# Altium footprint library 接插件.PcbLib: 88 footprints (part 5 of 6)
Each footprint in its own frame and in the unit in brackets; x right, y up, seen from the top. Pads: shape width x height; smd on the part's side, far side on the other; paste and mask are expansions set on the pad; w line width, h text height; cw(c..) or ccw(c..) is an arc to the next point about the centre after c.
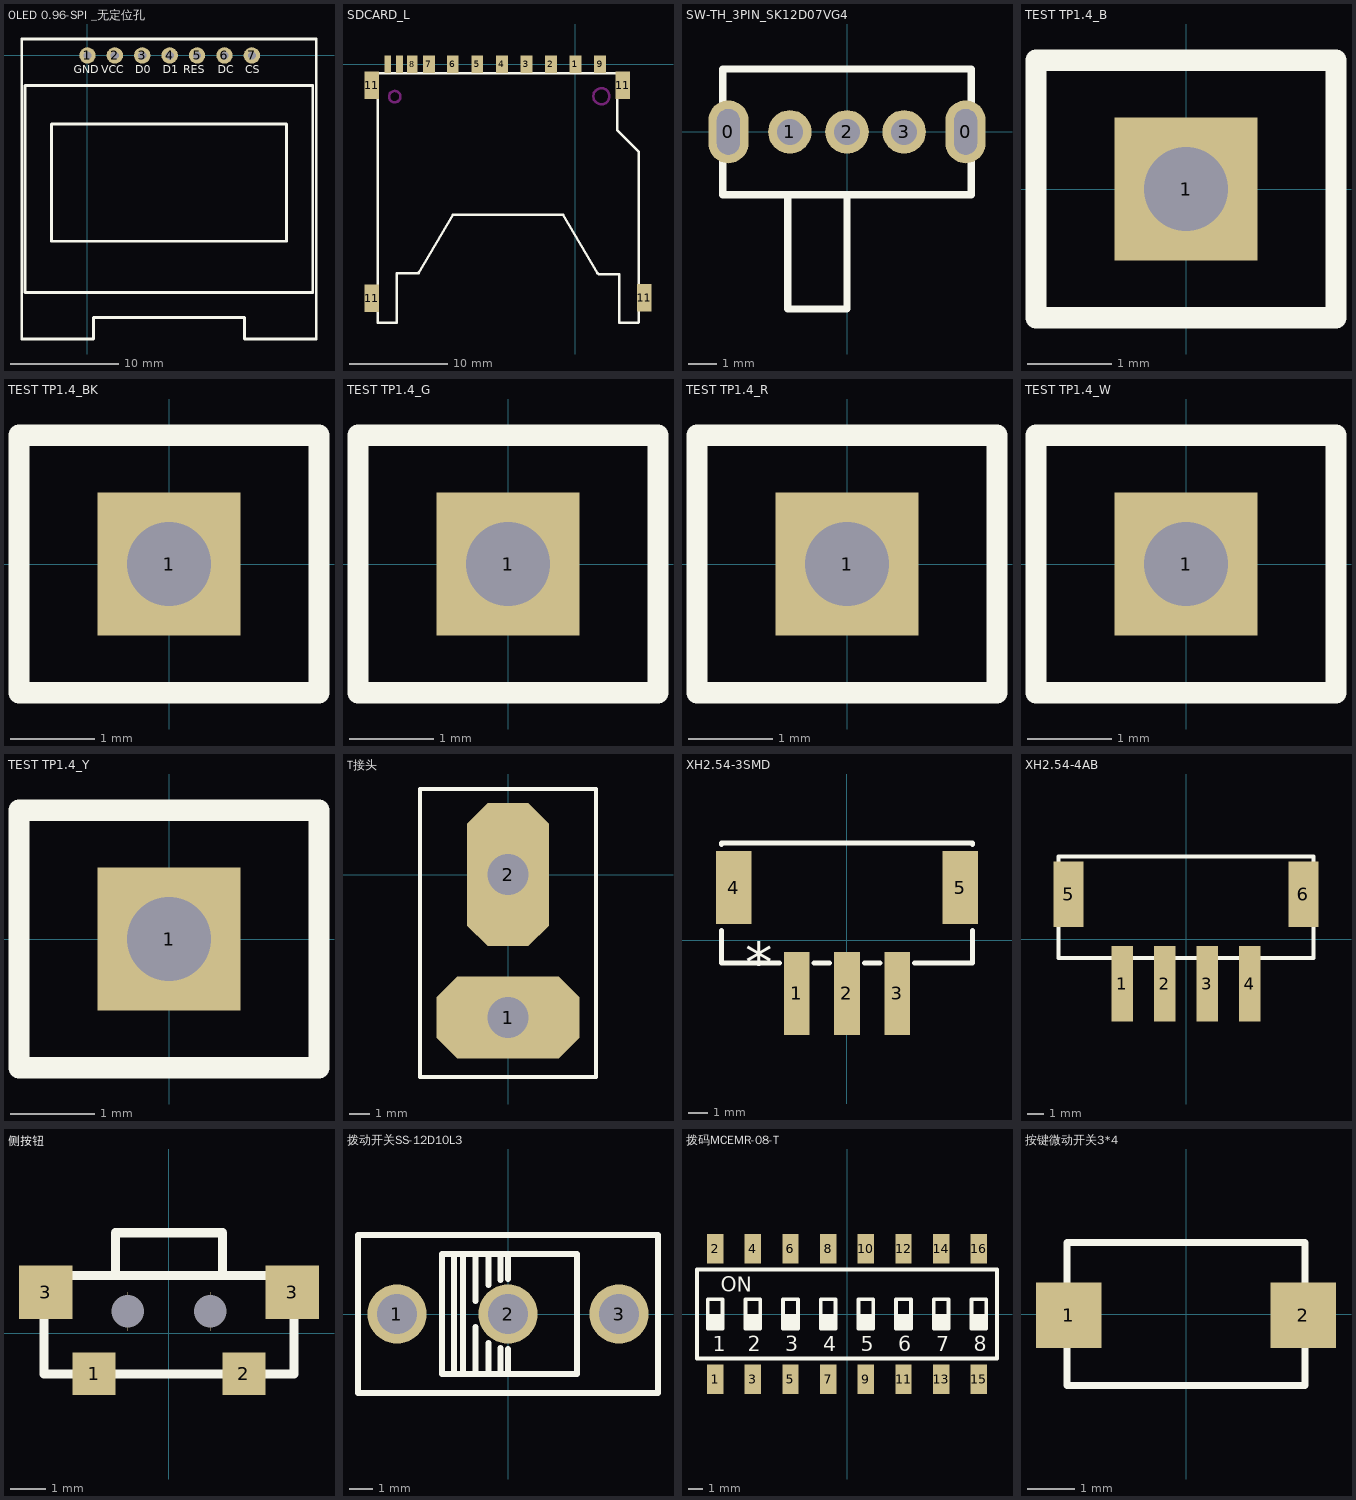
[diagram p4: the footprints below, top view; thin cyan lines are the x and y axes]

## OLED 0.96-SPI _无定位孔 [mil]
pads (7):
  round 60 hole 30: 1(0,0) 2(100,0) 3(200,0) 4(300,0) 5(400,0) 6(500,0) 7(600,0)
Top Overlay:
  lines w10: -239.8,-1034.49 22.01,-1034.49 22.01,-955.75 573.19,-955.75 573.19,-1034.49 835,-1034.49 835,60 -239.8,60 -239.8,-1034.49 ; -227.5,-865 822.5,-865 822.5,-110 -227.5,-110 -227.5,-865 ; -131.25,-677.5 726.25,-677.5 726.25,-250 -131.25,-250 -131.25,-677.5
  text "GND" at -50,-75 h50
  text "VCC" at 50,-75 h50
  text "D0" at 175,-75 h50
  text "D1" at 275,-75 h50
  text "RES" at 350,-75 h50
  text "DC" at 475,-75 h50
  text "CS" at 575,-75 h50
3D body "OLED带PCB.step": height 333.57, standoff -93.43, extent -227.57,-1035.59 823.61,61.26

## SDCARD_L [mm]
pads (15):
  rect 1.2x1.8 smd: 1(0,0) 2(-2.489,0) 3(-4.983,-0.009) 4(-7.483,-0.009) 5(-9.983,-0.009) 6(-12.483,-0.009) 7(-14.908,-0.009) 9(2.517,-0.009)
  rect 1.1x1.8 smd: 8(-16.612,0)
  rect 0.7x1.8 smd: 10(-17.908,-0.009) 12(-19.101,0)
  rect 1.5x2.8 smd: 11(-20.726,-23.834) 11(-20.726,-2.143) 11(4.826,-2.143) 11(7.01,-23.784)
Top Overlay:
  lines w0.254: -18.158,-21.3 -18.158,-26.3 -20.131,-26.3 -20.131,-0.914 -20.117,-0.9 4.242,-0.9 4.242,-6.71 6.431,-8.899 6.442,-8.899 6.442,-26.273 6.415,-26.3 4.442,-26.3 4.442,-21.402 2.4,-21.402 2.242,-21.244 ; -18.107,-21.294 -16.065,-21.294 -15.907,-21.136 ; -15.958,-21.294 -12.446,-15.3 ; -12.458,-15.3 -1.258,-15.3 2.242,-21.294
Keep-Out Layer:
  circle w0.254: c-18.39,-3.3 r0.58
  circle w0.254: c2.642,-3.26 r0.82

## SW-TH_3PIN_SK12D07VG4 [mil]
pads (5):
  oval 55.12x86.61 hole 31.5 slot 62.99 at 90 deg: 0(-163.39,0) 0(163.39,0)
  round 60 hole 36: 1(-78.74,0) 2(0,0) 3(78.74,0)
Top Overlay:
  lines w10: -171.26,86.61 171.26,86.61 171.26,-86.61 ; -171.22,86.65 -171.22,-86.57 171.3,-86.57 ; -81.69,-86.61 -81.69,-244.09 0,-244.09 0,-86.61

## TEST TP1.4_B [mm] "蓝色，测试环"
pads (1):
  rect 1.7x1.7 hole 1: 1(0,0)
Top Overlay:
  lines w0.254: -1.778,-1.524 1.778,-1.524 1.778,1.524 -1.778,1.524 -1.778,-1.524
3D body "TEST 3.5R_B.STEP": height 5.41, standoff -3.15, extent -1.675,-1.4 1.675,1.4

## TEST TP1.4_BK [mm] "黑色，测试环"
pads (1):
  rect 1.7x1.7 hole 1: 1(0,0)
Top Overlay:
  lines w0.254: -1.778,-1.524 -1.778,1.524 1.778,1.524 1.778,-1.524 -1.778,-1.524
3D body "TEST 3.5R_BK.STEP": height 5.41, standoff -3.15, extent -1.675,-1.4 1.675,1.4

## TEST TP1.4_G [mm] "绿色，测试环"
pads (1):
  rect 1.7x1.7 hole 1: 1(0,0)
Top Overlay:
  lines w0.254: -1.778,-1.524 1.778,-1.524 1.778,1.524 -1.778,1.524 -1.778,-1.524
3D body "TEST 3.5R_G.STEP": height 5.41, standoff -3.15, extent -1.675,-1.4 1.675,1.4

## TEST TP1.4_R [mm] "红色，测试环"
pads (1):
  rect 1.7x1.7 hole 1: 1(0,0)
Top Overlay:
  lines w0.254: -1.778,-1.524 1.778,-1.524 1.778,1.524 -1.778,1.524 -1.778,-1.524
3D body "TEST 3.5R_R.STEP": height 5.41, standoff -3.15, extent -1.675,-1.4 1.675,1.4

## TEST TP1.4_W [mm] "白色，测试环"
pads (1):
  rect 1.7x1.7 hole 1: 1(0,0)
Top Overlay:
  lines w0.254: -1.778,-1.524 -1.778,1.524 1.778,1.524 1.778,-1.524 -1.778,-1.524
3D body "TEST 3.5R_W.STEP": height 5.41, standoff -3.15, extent -1.675,-1.4 1.675,1.4

## TEST TP1.4_Y [mm] "黄色，测试环"
pads (1):
  rect 1.7x1.7 hole 1: 1(0,0)
Top Overlay:
  lines w0.254: -1.778,-1.524 1.778,-1.524 1.778,1.524 -1.778,1.524 -1.778,-1.524
3D body "TEST 3.5R_Y.STEP": height 5.41, standoff -3.15, extent -1.675,-1.4 1.675,1.4

## T接头 [mm]
pads (2):
  oct 7x4 hole 2 square: 1(0,-7)
  oct 4x7 hole 2 square: 2(0,0)
Top Overlay:
  lines w0.2: -4.318,-9.906 4.318,-9.906 4.318,-8.217 4.318,-2.233 4.318,4.191 -4.318,4.191 -4.318,-9.906

## XH2.54-3SMD [mm] "CONN-SMD_3P-P2.54_XH2.54-3AB"
pads (5):
  rect 1.3x4.2 smd: 1(-2.54,-2.675) 2(0,-2.675) 3(2.54,-2.675)
  rect 1.801x3.7 smd: 4(-5.741,2.675) 5(5.741,2.675)
Top Overlay:
  lines w0.254: -6.349,0.493 -6.349,-1.135 -3.421,-1.135 ; -6.349,4.857 -6.349,4.925 6.35,4.925 6.35,4.857 ; -1.659,-1.135 -0.881,-1.135 ; 0.881,-1.135 1.659,-1.135 ; 3.421,-1.135 6.35,-1.135 6.35,0.493
  text "*" at -3.759,0.77 h2.03
3D body "User Library-CWF-3.step": height 5.85, standoff 0.15, extent -5.047,-4.869 4.953,5.631

## XH2.54-4AB [mm]
pads (6):
  rect 1.3x4.5 smd: 1(-3.811,-2.675) 2(-1.271,-2.675) 3(1.269,-2.675) 4(3.809,-2.675)
  rect 1.801x3.901 smd: 5(-7.011,2.675) 6(7.011,2.675)
Top Overlay:
  lines w0.254: -7.62,-1.135 7.619,-1.135 7.619,4.925 -0.922,4.925 -7.62,4.925 -7.62,-1.135

## 侧按钮 [mil]
height 61.02
pads (6):
  rect 47.24x47.24 smd: 1(-82.67,-45) 2(82.68,-45)
  rect 59.05x59.05 smd: 3(-135.82,45) 3(135.83,45)
  oval 0x43.03 hole 36 unplated mask+0: ""(-45.3,23.9) ""(45.3,23.9)
Top Overlay:
  lines w10: -59.05,65 -59.05,110.51 59.06,110.51 59.06,63.27 ; 137.8,-45.05 -137.79,-45.05 -137.79,63.27 137.8,63.27 137.8,-45

## 拨动开关SS-12D10L3 [mm]
pads (3):
  round 2.5 hole 1.7: 1(-4.7,0) 2(0,0) 3(4.7,0)
Top Overlay:
  lines w0.254: -1.376,-2.54 -1.376,-0.544 ; -1.376,0.544 -1.376,2.54 ; -0.817,-2.54 -0.817,-1.235 ; -0.817,1.235 -0.817,2.54 ; -0.309,-2.54 -0.309,-1.448 ; -0.309,1.448 -0.309,2.54 ; -0.004,-2.54 -0.004,-1.481 ; -0.004,1.481 -0.004,2.54 ; -6.35,-3.35 6.35,-3.35 6.35,3.35 -6.35,3.35 -6.35,-3.35 ; -2.794,-2.54 2.921,-2.54 2.921,2.54 -2.794,2.54 -2.794,-2.54 ; -2.286,-2.54 -1.905,-2.54 -1.905,2.54 -2.286,2.54 -2.286,-2.54
Mechanical 15:
  lines w0.003: -0.025,0.3 0.025,0.351

## 拨码MCEMR-08-T [mm] "DIP SWITCH"
height 3.8
pads (16):
  rect 1.1x2 smd: 1(-8.89,-4.4) 2(-8.89,4.4) 3(-6.35,-4.4) 4(-6.35,4.4) 5(-3.81,-4.4) 6(-3.81,4.4) 7(-1.27,-4.4) 8(-1.27,4.4) 9(1.27,-4.4) 10(1.27,4.4) 11(3.81,-4.4) 12(3.81,4.4) 13(6.35,-4.4) 14(6.35,4.4) 15(8.89,-4.4) 16(8.89,4.4)
Top Overlay:
  rectangle: 8.39,-1 9.39,0
  rectangle: 5.85,-1 6.85,0
  rectangle: 3.31,-1 4.31,0
  rectangle: 0.77,-1 1.77,0
  rectangle: -1.77,-1 -0.77,0
  rectangle: -4.31,-1 -3.31,0
  rectangle: -6.85,-1 -5.85,0
  rectangle: -9.39,-1 -8.39,0
  lines w0.254: -10.11,-3 -10.11,3 10.11,3 10.11,-3 -10.11,-3 ; -9.39,-1 -8.39,-1 -8.39,1 -9.39,1 -9.39,-1 ; -6.85,-1 -6.85,1 -5.85,1 -5.85,-1 -6.85,-1 ; -4.31,-1 -3.31,-1 -3.31,1 -4.31,1 -4.31,-1 ; -1.77,-1 -0.77,-1 -0.77,1 -1.77,1 -1.77,-1 ; 0.77,-1 1.77,-1 1.77,1 0.77,1 0.77,-1 ; 3.31,-1 4.31,-1 4.31,1 3.31,1 3.31,-1 ; 5.85,-1 6.85,-1 6.85,1 5.85,1 5.85,-1 ; 8.39,-1 9.39,-1 9.39,1 8.39,1 8.39,-1
  text "ON" at -8.5,1.5 h1.02
  text "8" at 8.547,-2.5 h1.02
  text "7" at 6.007,-2.5 h1.02
  text "6" at 3.467,-2.5 h1.02
  text "5" at 0.927,-2.5 h1.02
  text "4" at -1.613,-2.5 h1.02
  text "3" at -4.153,-2.5 h1.02
  text "2" at -6.693,-2.5 h1.02
  text "1" at -9.055,-2.5 h1.02
3D body "SW3dPS-219-8MST.STEP": height 4.24, standoff -0.01, extent -10.18,-4.955 10.184,4.955

## 按键微动开关3*4 [mm]
pads (2):
  rect 1.4x1.4 smd: 1(-2.5,-0.024) 2(2.5,-0.024)
Top Overlay:
  lines w0.15: -2.54,-1.524 2.54,-1.524 2.54,1.524 -2.54,1.524 -2.54,-1.524
3D body "SW-PB 3X4.STEP": height 2.1, standoff -0.05, extent -2.5,-1.524 2.5,1.476